# Altium footprint library FootprintLib.PcbLib: 19 footprints (part 2 of 2)
Each footprint in its own frame and in the unit in brackets; x right, y up, seen from the top. Pads: shape width x height; smd on the part's side, far side on the other; paste and mask are expansions set on the pad; w line width, h text height; cw(c..) or ccw(c..) is an arc to the next point about the centre after c.
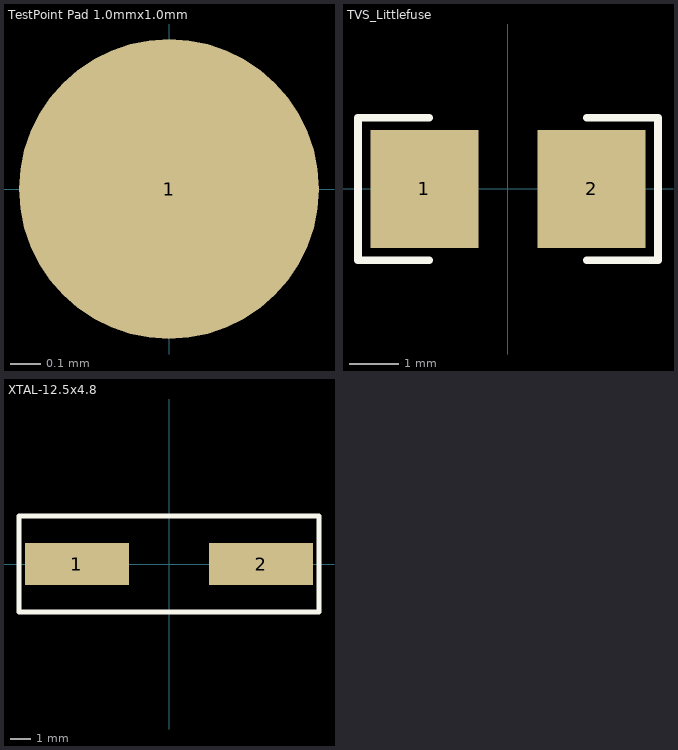
[diagram p1: the footprints below, top view; thin cyan lines are the x and y axes]

## TestPoint Pad 1.0mmx1.0mm [mm] "TestPoint Pad 1.0mmx1.0mm"
pads (1):
  round 1 smd mask+0.2: 1(0,0)

## TVS_Littlefuse [mm]
pads (2):
  rect 2.2x2.4 smd: 1(-1.7,0) 2(1.7,0)
Top Overlay:
  lines w0.16: -1.6,-1.45 -3.05,-1.45 -3.05,1.45 -1.6,1.45 ; 1.6,-1.45 3.05,-1.45 3.05,1.45 1.6,1.45
3D body "User Library-SMAJ.SLDPRT": height 2, standoff 0.01, extent -2.465,-1.27 2.465,1.27

## XTAL-12.5x4.8 [mm]
pads (2):
  rect 5.2x2.1 smd: 1(-4.6,0) 2(4.6,0)
Top Overlay:
  lines w0.254: -7.5,-2.4 -0.2,-2.4 7.5,-2.4 7.5,2.4 -0.3,2.4 -7.5,2.4 -7.5,-2.4
3D body "User Library-Crystal HC49_US-SM.SLDPRT": height 4.3, standoff 0, extent -6.4,-2.415 6.4,2.415